# Altium footprint library 针式电感.PcbLib: 75 footprints (part 1 of 5)
Each footprint in its own frame and in the unit in brackets; x right, y up, seen from the top. Pads: shape width x height; smd on the part's side, far side on the other; paste and mask are expansions set on the pad; w line width, h text height; cw(c..) or ccw(c..) is an arc to the next point about the centre after c.
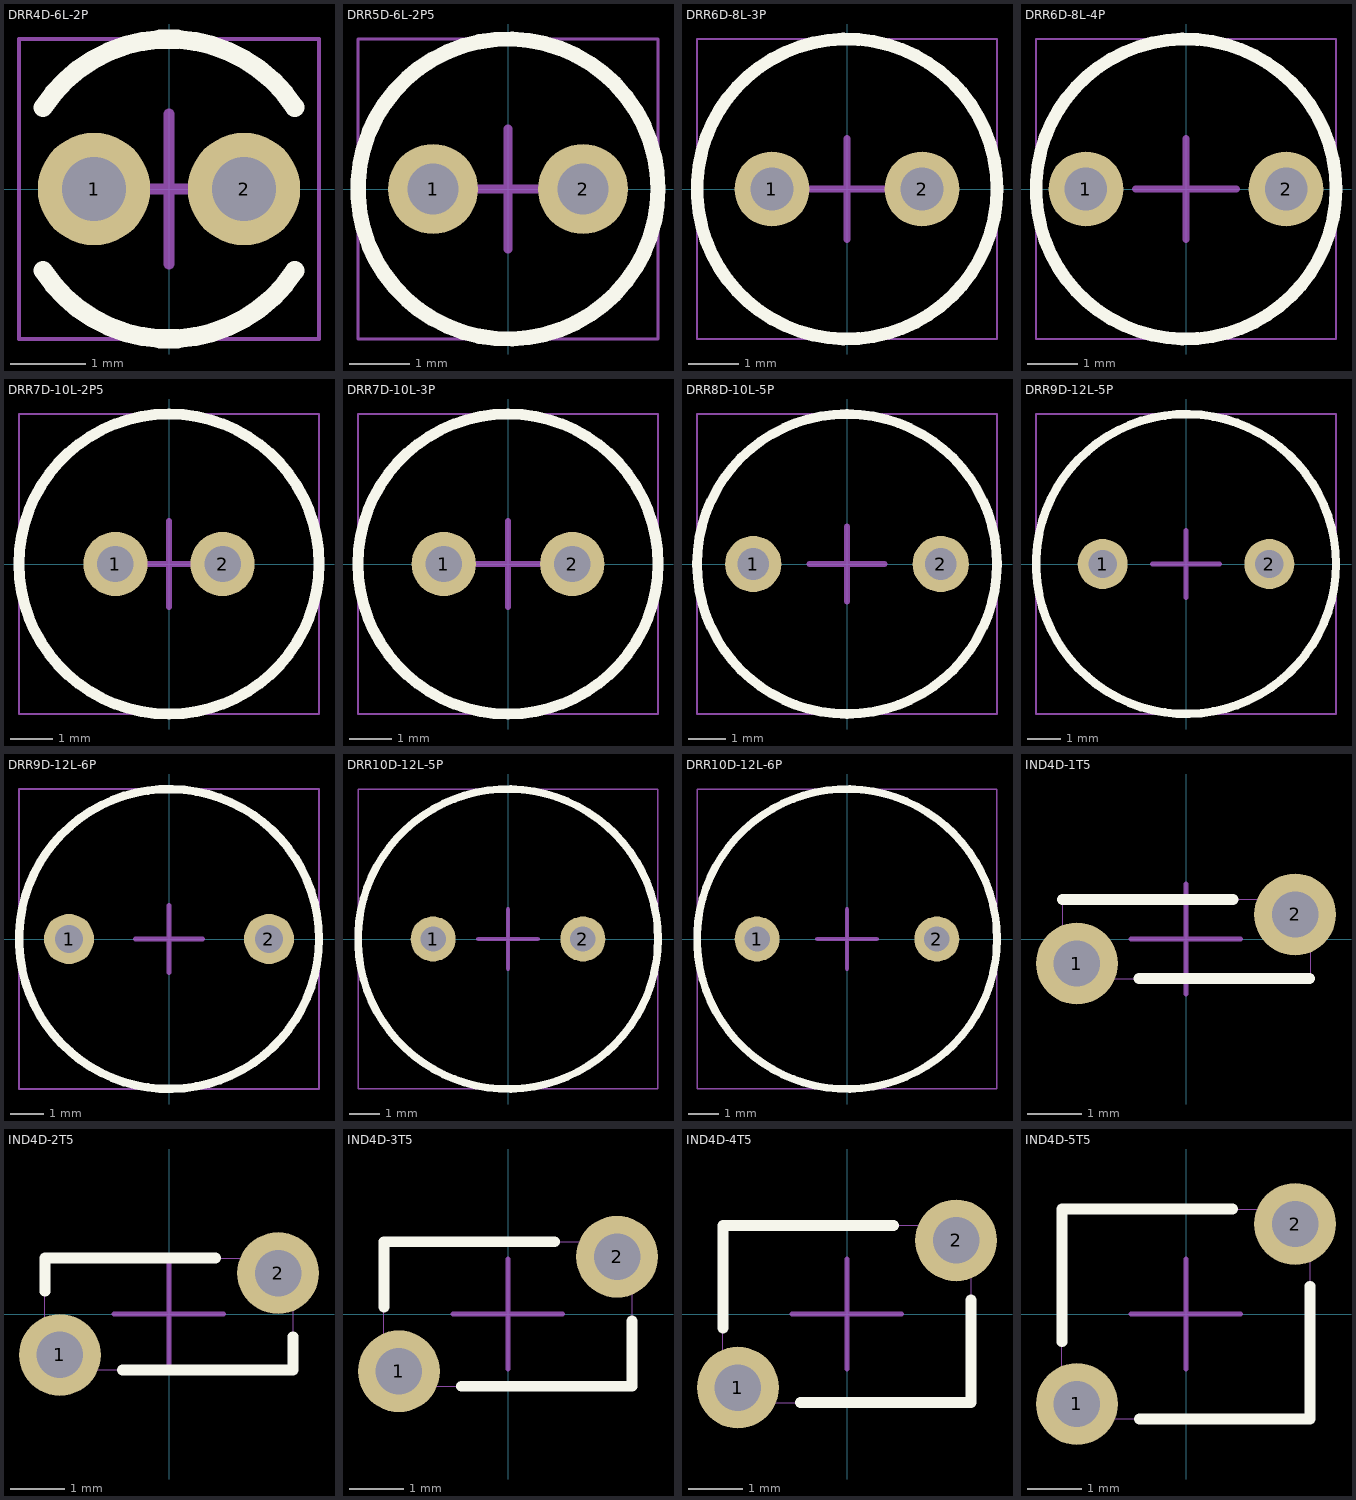
[diagram p0: the footprints below, top view; thin cyan lines are the x and y axes]

## DRR4D-6L-2P [mm] "针式工字电感"
height 6
pads (2):
  round 1.5 hole 0.85 unplated: 1(-1,0) 2(1,0)
Top Overlay:
  lines w0.254: -1.678,-1.088 ccw(c0,0) 1.677,-1.09 ; -1.678,1.088 cw(c0,0) 1.677,1.09
Mechanical 13:
  lines w0.05: -2,-2 -2,2 2,2 2,-2 -2,-2
Mechanical 15:
  lines w0.15: -1,0 1,0 ; 0,-1 0,1
3D body: height 6.1, standoff -3.9, extent -2,-2 2,2

## DRR5D-6L-2P5 [mm] "针式工字电感"
height 6
pads (2):
  round 1.5 hole 0.85 unplated: 1(-1.25,0) 2(1.25,0)
Top Overlay:
  circle w0.254: c0,0 r2.5
Mechanical 13:
  lines w0.05: -2.5,-2.5 2.5,-2.5 2.5,2.5 -2.5,2.5 -2.5,-2.5
Mechanical 15:
  lines w0.15: -1,0 1,0 ; 0,-1 0,1
3D body: height 6.1, standoff -3.9, extent -2.5,-2.5 2.5,2.5

## DRR6D-8L-3P [mm] "针式工字电感"
height 8
pads (2):
  round 1.5 hole 0.85 unplated: 1(-1.5,0) 2(1.5,0)
Top Overlay:
  circle w0.254: c0,0 r3
Mechanical 13:
  lines w0.05: -3,-3 3,-3 3,3 -3,3 -3,-3
Mechanical 15:
  lines w0.15: -1,0 1,0 ; 0,-1 0,1
3D body: height 8, standoff -4, extent -3,-3 3,3

## DRR6D-8L-4P [mm] "针式工字电感"
height 8
pads (2):
  round 1.5 hole 0.85 unplated: 1(-2,0) 2(2,0)
Top Overlay:
  circle w0.254: c0,0 r3
Mechanical 13:
  lines w0.05: -3,-3 3,-3 3,3 -3,3 -3,-3
Mechanical 15:
  lines w0.15: -1,0 1,0 ; 0,-1 0,1
3D body: height 8, standoff -4, extent -3,-3 3,3

## DRR7D-10L-2P5 [mm] "针式工字电感"
height 10
pads (2):
  round 1.5 hole 0.85 unplated: 1(-1.25,0) 2(1.25,0)
Top Overlay:
  circle w0.254: c0,0 r3.5
Mechanical 13:
  lines w0.05: -3.5,-3.5 3.5,-3.5 3.5,3.5 -3.5,3.5 -3.5,-3.5
Mechanical 15:
  lines w0.15: -1,0 1,0 ; 0,-1 0,1
3D body: height 10.5, standoff -3.5, extent -3.5,-3.5 3.5,3.5

## DRR7D-10L-3P [mm] "针式工字电感"
height 10
pads (2):
  round 1.5 hole 0.85 unplated: 1(-1.5,0) 2(1.5,0)
Top Overlay:
  circle w0.254: c0,0 r3.5
Mechanical 13:
  lines w0.05: -3.5,-3.5 -3.5,3.5 3.5,3.5 3.5,-3.5 -3.5,-3.5
Mechanical 15:
  lines w0.15: -1,0 1,0 ; 0,-1 0,1
3D body: height 10.5, standoff -3.5, extent -3.5,-3.5 3.5,3.5

## DRR8D-10L-5P [mm] "针式工字电感"
height 10
pads (2):
  round 1.5 hole 0.85 unplated: 1(-2.5,0) 2(2.5,0)
Top Overlay:
  circle w0.254: c0,0 r4
Mechanical 13:
  lines w0.05: -4,-4 4,-4 4,4 -4,4 -4,-4
Mechanical 15:
  lines w0.15: -1,0 1,0 ; 0,-1 0,1
3D body: height 10.5, standoff -3.5, extent -4,-4 4,4

## DRR9D-12L-5P [mm] "针式工字电感"
height 12
pads (2):
  round 1.5 hole 0.85 unplated: 1(-2.5,0) 2(2.5,0)
Top Overlay:
  circle w0.254: c0,0 r4.5
Mechanical 13:
  lines w0.05: -4.5,-4.5 4.5,-4.5 4.5,4.5 -4.5,4.5 -4.5,-4.5
Mechanical 15:
  lines w0.15: -1,0 1,0 ; 0,-1 0,1
3D body: height 12.5, standoff -3.5, extent -4.5,-4.5 4.5,4.5

## DRR9D-12L-6P [mm] "针式工字电感"
height 12
pads (2):
  round 1.5 hole 0.85 unplated: 1(-3,0) 2(3,0)
Top Overlay:
  circle w0.254: c0,0 r4.5
Mechanical 13:
  lines w0.05: -4.5,-4.5 4.5,-4.5 4.5,4.5 -4.5,4.5 -4.5,-4.5
Mechanical 15:
  lines w0.15: -1,0 1,0 ; 0,-1 0,1
3D body: height 12.5, standoff -3.5, extent -4.5,-4.5 4.5,4.5

## DRR10D-12L-5P [mm] "针式工字电感"
height 12
pads (2):
  round 1.5 hole 0.85 unplated: 1(-2.5,0) 2(2.5,0)
Top Overlay:
  circle w0.254: c0,0 r5.004
Mechanical 13:
  lines w0.05: -5,-5 -5,5 5,5 5,-5 -5,-5
Mechanical 15:
  lines w0.15: -1,0 1,0 ; 0,-1 0,1
3D body: height 12.5, standoff -3.5, extent -5,-5 5,5

## DRR10D-12L-6P [mm] "针式工字电感"
height 12
pads (2):
  round 1.5 hole 0.85 unplated: 1(-3,0) 2(3,0)
Top Overlay:
  circle w0.254: c0,0 r5.004
Mechanical 13:
  lines w0.05: -5,-5 -5,5 5,5 5,-5 -5,-5
Mechanical 15:
  lines w0.15: -1,0 1,0 ; 0,-1 0,1
3D body: height 12.5, standoff -3.5, extent -5,-5 5,5

## IND4D-1T5 [mm] "空芯线圈"
height 4.5
pads (2):
  round 1.5 hole 0.85 unplated: 1(-2,-0.45) 2(2,0.45)
Top Overlay:
  lines w0.2: -2.264,0.725 0.864,0.725 ; -0.864,-0.725 2.264,-0.725
Mechanical 13:
  lines w0.01: -2.264,-0.725 2.286,-0.725 2.286,0.725 -2.264,0.725 -2.264,-0.725
Mechanical 15:
  lines w0.1: -1,0 0.991,0 ; 0,-1 0,1
3D body: height 4.77, standoff -3.5, extent -2.264,-0.725 2.286,0.725

## IND4D-2T5 [mm] "空芯线圈"
height 4.5
pads (2):
  round 1.5 hole 0.85 unplated: 1(-2,-0.75) 2(2,0.75)
Top Overlay:
  lines w0.2: -2.275,0.417 -2.275,1.025 0.853,1.025 ; -0.853,-1.025 2.275,-1.025 2.275,-0.417
Mechanical 13:
  lines w0.01: -2.275,-1.025 -2.275,1.025 2.275,1.025 2.275,-1.025 -2.275,-1.025
Mechanical 15:
  lines w0.1: -1,0 0.991,0 ; 0,-1 0,1
3D body: height 4.77, standoff -3.5, extent -2.275,-1.025 2.275,1.025

## IND4D-3T5 [mm] "空芯线圈"
height 4.5
pads (2):
  round 1.5 hole 0.85 unplated: 1(-2,-1.05) 2(2,1.05)
Top Overlay:
  lines w0.2: -2.275,0.127 -2.275,1.325 0.853,1.325 ; -0.853,-1.325 2.275,-1.325 2.275,-0.127
Mechanical 13:
  lines w0.01: -2.275,-1.325 2.275,-1.325 2.275,1.325 -2.275,1.325 -2.275,-1.325
Mechanical 15:
  lines w0.1: -1,0 0.991,0 ; 0,-1 0,1
3D body: height 4.77, standoff -3.5, extent -2.275,-1.325 2.275,1.325

## IND4D-4T5 [mm] "空芯线圈"
height 4.5
pads (2):
  round 1.5 hole 0.85 unplated: 1(-2,-1.35) 2(2,1.35)
Top Overlay:
  lines w0.2: -2.275,-0.254 -2.275,1.625 0.853,1.625 ; -0.853,-1.625 2.275,-1.625 2.275,0.254
Mechanical 13:
  lines w0.01: -2.275,-1.625 -2.275,1.625 2.275,1.625 2.275,-1.625 -2.275,-1.625
Mechanical 15:
  lines w0.1: -1,0 0.991,0 ; 0,-1 0,1
3D body: height 4.77, standoff -3.5, extent -2.275,-1.625 2.275,1.625

## IND4D-5T5 [mm] "空芯线圈"
height 4.5
pads (2):
  round 1.5 hole 0.85 unplated: 1(-2,-1.65) 2(2,1.65)
Top Overlay:
  lines w0.2: -2.275,-0.508 -2.275,1.925 0.853,1.925 ; -0.853,-1.925 2.275,-1.925 2.275,0.508
Mechanical 13:
  lines w0.01: -2.275,-1.925 -2.275,1.925 2.275,1.925 2.275,-1.925 -2.275,-1.925
Mechanical 15:
  lines w0.1: -1,0 0.991,0 ; 0,-1 0,1
3D body: height 4.77, standoff -3.5, extent -2.275,-1.925 2.275,1.925